# Altium footprint library Connect.PcbLib: 272 footprints (part 4 of 17)
Each footprint in its own frame and in the unit in brackets; x right, y up, seen from the top. Pads: shape width x height; smd on the part's side, far side on the other; paste and mask are expansions set on the pad; w line width, h text height; cw(c..) or ccw(c..) is an arc to the next point about the centre after c.
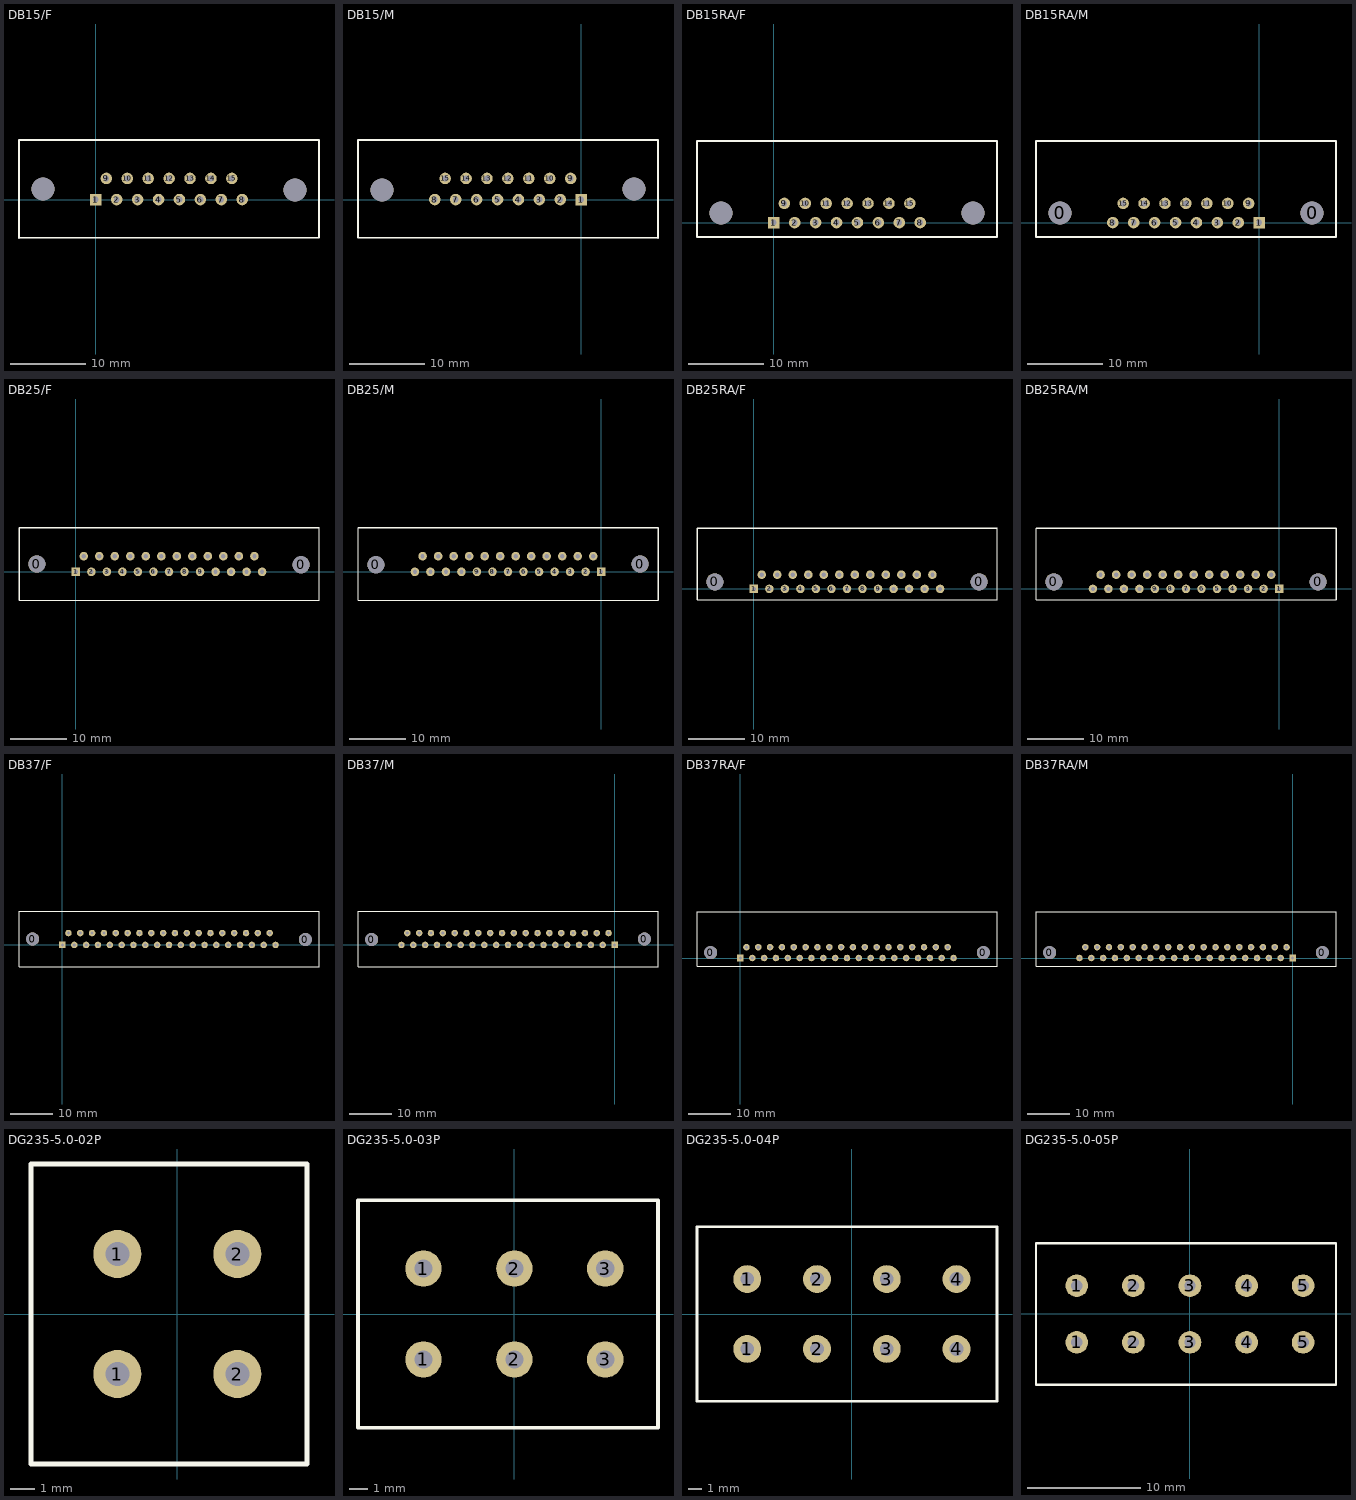
[diagram p3: the footprints below, top view; thin cyan lines are the x and y axes]

## DB15/F [mil]
pads (17):
  rect 60x60 hole 30: 1(0,0)
  round 60 hole 30: 2(109,0) 3(218,0) 4(327,0) 5(436,0) 6(545,0) 7(654,0) 8(763,0) 9(55,110) 10(164,110) 11(273,110) 12(382,110) 13(491,110) 14(600,110) 15(709,110)
  round 120 hole 120: ""(-275,55) ""(1038,50)
Top Overlay:
  lines w8: -400,-200 1163,-200 1163,310
  lines w10: -400,-200 -400,310 1163,310

## DB15/M [mil]
pads (17):
  rect 60x60 hole 30: 1(0,0)
  round 60 hole 30: 2(-109,0) 3(-218,0) 4(-327,0) 5(-436,0) 6(-545,0) 7(-654,0) 8(-763,0) 9(-55,110) 10(-164,110) 11(-273,110) 12(-382,110) 13(-491,110) 14(-600,110) 15(-709,110)
  round 120 hole 120: ""(-1038,50) ""(275,55)
Top Overlay:
  lines w8: -1163,310 -1163,-200 400,-200
  lines w10: -1163,310 400,310 400,-200

## DB15RA/F [mil]
pads (17):
  rect 60x60 hole 30: 1(0,0)
  round 60 hole 30: 2(109,0) 3(218,0) 4(327,0) 5(436,0) 6(545,0) 7(654,0) 8(763,0) 9(55,100) 10(164,100) 11(273,100) 12(382,100) 13(491,100) 14(600,100) 15(709,100)
  round 120 hole 120: ""(-275,50) ""(1038,50)
Top Overlay:
  lines w8: -400,-75 1163,-75 1163,425
  lines w10: -400,-75 -400,425 1163,425

## DB15RA/M [mil]
pads (17):
  round 120 hole 120: 0(-1038,50) 0(275,50)
  rect 60x60 hole 30: 1(0,0)
  round 60 hole 30: 2(-109,0) 3(-218,0) 4(-327,0) 5(-436,0) 6(-545,0) 7(-654,0) 8(-763,0) 9(-55,100) 10(-164,100) 11(-273,100) 12(-382,100) 13(-491,100) 14(-600,100) 15(-709,100)
Top Overlay:
  lines w8: -1163,425 -1163,-75 400,-75
  lines w10: -1163,425 400,425 400,-75

## DB25/F [mil]
pads (27):
  round 120 hole 120: 0(-275,55) 0(1583,50)
  rect 60x60 hole 30: 1(0,0)
  round 60 hole 30: 2(109,0) 3(218,0) 4(327,0) 5(436,0) 6(545,0) 7(654,0) 8(763,0) 9(872,0) 10(981,0) 11(1090,0) 12(1199,0) 13(1308,0) 14(55,110) 15(164,110) 16(273,110) 17(382,110) 18(491,110) 19(600,110) 20(709,110) 21(818,110) 22(927,110) 23(1036,110) 24(1145,110) 25(1254,110)
Top Overlay:
  lines w8: -400,-200 1708,-200 1708,310
  lines w10: -400,-200 -400,310 1708,310

## DB25/M [mil]
pads (27):
  round 120 hole 120: 0(-1583,50) 0(275,55)
  rect 60x60 hole 30: 1(0,0)
  round 60 hole 30: 2(-109,0) 3(-218,0) 4(-327,0) 5(-436,0) 6(-545,0) 7(-654,0) 8(-763,0) 9(-872,0) 10(-981,0) 11(-1090,0) 12(-1199,0) 13(-1308,0) 14(-55,110) 15(-164,110) 16(-273,110) 17(-382,110) 18(-491,110) 19(-600,110) 20(-709,110) 21(-818,110) 22(-927,110) 23(-1036,110) 24(-1145,110) 25(-1254,110)
Top Overlay:
  lines w8: -1708,310 -1708,-200 400,-200
  lines w10: -1708,310 400,310 400,-200

## DB25RA/F [mil]
pads (27):
  round 120 hole 120: 0(-275,50) 0(1583,50)
  rect 60x60 hole 30: 1(0,0)
  round 60 hole 30: 2(109,0) 3(218,0) 4(327,0) 5(436,0) 6(545,0) 7(654,0) 8(763,0) 9(872,0) 10(981,0) 11(1090,0) 12(1199,0) 13(1308,0) 14(55,100) 15(164,100) 16(273,100) 17(382,100) 18(491,100) 19(600,100) 20(709,100) 21(818,100) 22(927,100) 23(1036,100) 24(1145,100) 25(1254,100)
Top Overlay:
  lines w8: -400,-75 1708,-75 1708,425
  lines w10: -400,-75 -400,425 1708,425

## DB25RA/M [mil]
pads (27):
  round 120 hole 120: 0(-1583,50) 0(275,50)
  rect 60x60 hole 30: 1(0,0)
  round 60 hole 30: 2(-109,0) 3(-218,0) 4(-327,0) 5(-436,0) 6(-545,0) 7(-654,0) 8(-763,0) 9(-872,0) 10(-981,0) 11(-1090,0) 12(-1199,0) 13(-1308,0) 14(-55,100) 15(-164,100) 16(-273,100) 17(-382,100) 18(-491,100) 19(-600,100) 20(-709,100) 21(-818,100) 22(-927,100) 23(-1036,100) 24(-1145,100) 25(-1254,100)
Top Overlay:
  lines w8: -1708,425 -1708,-75 400,-75
  lines w10: -1708,425 400,425 400,-75

## DB37/F [mil]
pads (39):
  round 120 hole 120: 0(-275,55) 0(2237,50)
  rect 60x60 hole 30: 1(0,0)
  round 60 hole 30: 2(109,0) 3(218,0) 4(327,0) 5(436,0) 6(545,0) 7(654,0) 8(763,0) 9(872,0) 10(981,0) 11(1090,0) 12(1199,0) 13(1308,0) 14(1417,0) 15(1526,0) 16(1635,0) 17(1744,0) 18(1853,0) 19(1962,0) 20(55,110) 21(164,110) 22(273,110) 23(382,110) 24(491,110) 25(600,110) 26(709,110) 27(818,110) 28(927,110) 29(1036,110) 30(1145,110) 31(1254,110) 32(1363,110) 33(1472,110) 34(1581,110) 35(1690,110) 36(1799,110) 37(1908,110)
Top Overlay:
  lines w8: -400,-200 2362,-200 2362,310
  lines w10: -400,-200 -400,310 2362,310

## DB37/M [mil]
pads (39):
  round 120 hole 120: 0(-2237,50) 0(275,55)
  rect 60x60 hole 30: 1(0,0)
  round 60 hole 30: 2(-109,0) 3(-218,0) 4(-327,0) 5(-436,0) 6(-545,0) 7(-654,0) 8(-763,0) 9(-872,0) 10(-981,0) 11(-1090,0) 12(-1199,0) 13(-1308,0) 14(-1417,0) 15(-1526,0) 16(-1635,0) 17(-1744,0) 18(-1853,0) 19(-1962,0) 20(-55,110) 21(-164,110) 22(-273,110) 23(-382,110) 24(-491,110) 25(-600,110) 26(-709,110) 27(-818,110) 28(-927,110) 29(-1036,110) 30(-1145,110) 31(-1254,110) 32(-1363,110) 33(-1472,110) 34(-1581,110) 35(-1690,110) 36(-1799,110) 37(-1908,110)
Top Overlay:
  lines w8: -2362,310 -2362,-200 400,-200
  lines w10: -2362,310 400,310 400,-200

## DB37RA/F [mil]
pads (39):
  round 120 hole 120: 0(-275,50) 0(2237,50)
  rect 60x60 hole 30: 1(0,0)
  round 60 hole 30: 2(109,0) 3(218,0) 4(327,0) 5(436,0) 6(545,0) 7(654,0) 8(763,0) 9(872,0) 10(981,0) 11(1090,0) 12(1199,0) 13(1308,0) 14(1417,0) 15(1526,0) 16(1635,0) 17(1744,0) 18(1853,0) 19(1962,0) 20(55,100) 21(164,100) 22(273,100) 23(382,100) 24(491,100) 25(600,100) 26(709,100) 27(818,100) 28(927,100) 29(1036,100) 30(1145,100) 31(1254,100) 32(1363,100) 33(1472,100) 34(1581,100) 35(1690,100) 36(1799,100) 37(1908,100)
Top Overlay:
  lines w8: -400,-75 2362,-75 2362,425
  lines w10: -400,-75 -400,425 2362,425

## DB37RA/M [mil]
pads (39):
  round 120 hole 120: 0(-2237,50) 0(275,50)
  rect 60x60 hole 30: 1(0,0)
  round 60 hole 30: 2(-109,0) 3(-218,0) 4(-327,0) 5(-436,0) 6(-545,0) 7(-654,0) 8(-763,0) 9(-872,0) 10(-981,0) 11(-1090,0) 12(-1199,0) 13(-1308,0) 14(-1417,0) 15(-1526,0) 16(-1635,0) 17(-1744,0) 18(-1853,0) 19(-1962,0) 20(-55,100) 21(-164,100) 22(-273,100) 23(-382,100) 24(-491,100) 25(-600,100) 26(-709,100) 27(-818,100) 28(-927,100) 29(-1036,100) 30(-1145,100) 31(-1254,100) 32(-1363,100) 33(-1472,100) 34(-1581,100) 35(-1690,100) 36(-1799,100) 37(-1908,100)
Top Overlay:
  lines w8: -2362,425 -2362,-75 400,-75
  lines w10: -2362,425 400,425 400,-75

## DG235-5.0-02P [mm]
height 15.5
pads (4):
  round 2 hole 1: 1(-2.5,-2.5) 1(-2.5,2.5) 2(2.5,-2.5) 2(2.5,2.5)
Top Overlay:
  lines w0.2: -6.1,-6.25 5.4,-6.25 5.4,6.25 -6.1,6.25 -6.1,-6.25
3D body: height 7, standoff 0, extent -4.7,-6.1 0.275,6.1
3D body: height 9, standoff 7, extent -4.7,-2.5 -0.45,2.5
3D body: height 11, standoff 9, extent -4.425,-1.25 -2.425,1.25
3D body: height 12, standoff 11, extent -4.7,-2.75 -0.45,2
3D body: height 6, standoff 2, extent -4.25,-6.15 -0.25,3.85
3D body: height 0, standoff -3.6, extent -2.7,2.1 -2.3,2.9
3D body: height 0, standoff -3.6, extent -2.7,-2.9 -2.3,-2.1
3D body: height 0, standoff -3.6, extent 2.3,-2.9 2.7,-2.1
3D body: height 0, standoff -3.6, extent 2.3,2.1 2.7,2.9
3D body: height 6, standoff 2, extent 0.75,-6.15 4.75,3.85
3D body: height 12, standoff 11, extent 0.3,-2.75 4.55,2
3D body: height 11, standoff 9, extent 0.575,-1.25 2.575,1.25
3D body: height 9, standoff 7, extent 0.3,-2.5 4.55,2.5
3D body: height 7, standoff 0, extent 0.3,-6.1 5.275,6.1

## DG235-5.0-03P [mm]
height 15.5
pads (6):
  round 2 hole 1: 1(-5,-2.5) 1(-5,2.5) 2(0,-2.5) 2(0,2.5) 3(5,-2.5) 3(5,2.5)
Top Overlay:
  lines w0.2: -8.6,-6.25 -8.6,6.25 7.9,6.25 7.9,-6.25 -8.6,-6.25
3D body: height 7, standoff 0, extent -2.2,-6.1 2.775,6.1
3D body: height 9, standoff 7, extent -2.2,-2.5 2.05,2.5
3D body: height 11, standoff 9, extent -1.925,-1.25 0.075,1.25
3D body: height 12, standoff 11, extent -2.2,-2.75 2.05,2
3D body: height 6, standoff 2, extent -1.75,-6.15 2.25,3.85
3D body: height 0, standoff -3.6, extent -0.2,2.1 0.2,2.9
3D body: height 0, standoff -3.6, extent -0.2,-2.9 0.2,-2.1
3D body: height 0, standoff -3.6, extent -5.2,-2.9 -4.8,-2.1
3D body: height 0, standoff -3.6, extent -5.2,2.1 -4.8,2.9
3D body: height 6, standoff 2, extent -6.75,-6.15 -2.75,3.85
3D body: height 12, standoff 11, extent -7.2,-2.75 -2.95,2
3D body: height 11, standoff 9, extent -6.925,-1.25 -4.925,1.25
3D body: height 9, standoff 7, extent -7.2,-2.5 -2.95,2.5
3D body: height 7, standoff 0, extent -7.2,-6.1 -2.225,6.1
3D body: height 0, standoff -3.6, extent 4.8,-2.9 5.2,-2.1
3D body: height 0, standoff -3.6, extent 4.8,2.1 5.2,2.9
3D body: height 6, standoff 2, extent 3.25,-6.15 7.25,3.85
3D body: height 12, standoff 11, extent 2.8,-2.75 7.05,2
3D body: height 11, standoff 9, extent 3.075,-1.25 5.075,1.25
3D body: height 9, standoff 7, extent 2.8,-2.5 7.05,2.5
3D body: height 7, standoff 0, extent 2.8,-6.1 7.775,6.1

## DG235-5.0-04P [mm]
height 15.5
pads (8):
  round 2 hole 1: 1(-7.5,-2.5) 1(-7.5,2.5) 2(-2.5,-2.5) 2(-2.5,2.5) 3(2.5,-2.5) 3(2.5,2.5) 4(7.5,-2.5) 4(7.5,2.5)
Top Overlay:
  lines w0.2: -11.1,-6.25 -11.1,6.25 10.4,6.25 10.4,-6.25 -11.1,-6.25
3D body: height 7, standoff 0, extent -4.7,-6.1 0.275,6.1
3D body: height 9, standoff 7, extent -4.7,-2.5 -0.45,2.5
3D body: height 11, standoff 9, extent -4.425,-1.25 -2.425,1.25
3D body: height 12, standoff 11, extent -4.7,-2.75 -0.45,2
3D body: height 6, standoff 2, extent -4.25,-6.15 -0.25,3.85
3D body: height 0, standoff -3.6, extent -2.7,2.1 -2.3,2.9
3D body: height 0, standoff -3.6, extent -2.7,-2.9 -2.3,-2.1
3D body: height 0, standoff -3.6, extent -7.7,-2.9 -7.3,-2.1
3D body: height 0, standoff -3.6, extent -7.7,2.1 -7.3,2.9
3D body: height 6, standoff 2, extent -9.25,-6.15 -5.25,3.85
3D body: height 12, standoff 11, extent -9.7,-2.75 -5.45,2
3D body: height 11, standoff 9, extent -9.425,-1.25 -7.425,1.25
3D body: height 9, standoff 7, extent -9.7,-2.5 -5.45,2.5
3D body: height 7, standoff 0, extent -9.7,-6.1 -4.725,6.1
3D body: height 0, standoff -3.6, extent 2.3,-2.9 2.7,-2.1
3D body: height 0, standoff -3.6, extent 2.3,2.1 2.7,2.9
3D body: height 6, standoff 2, extent 0.75,-6.15 4.75,3.85
3D body: height 12, standoff 11, extent 0.3,-2.75 4.55,2
3D body: height 11, standoff 9, extent 0.575,-1.25 2.575,1.25
3D body: height 9, standoff 7, extent 0.3,-2.5 4.55,2.5
3D body: height 7, standoff 0, extent 0.3,-6.1 5.275,6.1
3D body: height 7, standoff 0, extent 5.3,-6.1 10.275,6.1
3D body: height 9, standoff 7, extent 5.3,-2.5 9.55,2.5
3D body: height 11, standoff 9, extent 5.575,-1.25 7.575,1.25
3D body: height 12, standoff 11, extent 5.3,-2.75 9.55,2
3D body: height 6, standoff 2, extent 5.75,-6.15 9.75,3.85
3D body: height 0, standoff -3.6, extent 7.3,2.1 7.7,2.9
3D body: height 0, standoff -3.6, extent 7.3,-2.9 7.7,-2.1

## DG235-5.0-05P [mm]
height 15.5
pads (10):
  round 2 hole 1: 1(-10,-2.5) 1(-10,2.5) 2(-5,-2.5) 2(-5,2.5) 3(0,-2.5) 3(0,2.5) 4(5,-2.5) 4(5,2.5) 5(10,-2.5) 5(10,2.5)
Top Overlay:
  lines w0.2: -13.6,-6.25 12.9,-6.25 12.9,6.25 -13.6,6.25 -13.6,-6.25
3D body: height 0, standoff -3.6, extent 4.8,-2.9 5.2,-2.1
3D body: height 0, standoff -3.6, extent 4.8,2.1 5.2,2.9
3D body: height 6, standoff 2, extent 3.25,-6.15 7.25,3.85
3D body: height 12, standoff 11, extent 2.8,-2.75 7.05,2
3D body: height 11, standoff 9, extent 3.075,-1.25 5.075,1.25
3D body: height 9, standoff 7, extent 2.8,-2.5 7.05,2.5
3D body: height 7, standoff 0, extent 2.8,-6.1 7.775,6.1
3D body: height 7, standoff 0, extent -2.2,-6.1 2.775,6.1
3D body: height 9, standoff 7, extent -2.2,-2.5 2.05,2.5
3D body: height 11, standoff 9, extent -1.925,-1.25 0.075,1.25
3D body: height 12, standoff 11, extent -2.2,-2.75 2.05,2
3D body: height 6, standoff 2, extent -1.75,-6.15 2.25,3.85
3D body: height 0, standoff -3.6, extent -0.2,2.1 0.2,2.9
3D body: height 0, standoff -3.6, extent -0.2,-2.9 0.2,-2.1
3D body: height 7, standoff 0, extent -12.2,-6.1 -7.225,6.1
3D body: height 9, standoff 7, extent -12.2,-2.5 -7.95,2.5
3D body: height 11, standoff 9, extent -11.925,-1.25 -9.925,1.25
3D body: height 12, standoff 11, extent -12.2,-2.75 -7.95,2
3D body: height 6, standoff 2, extent -11.75,-6.15 -7.75,3.85
3D body: height 0, standoff -3.6, extent -10.2,2.1 -9.8,2.9
3D body: height 0, standoff -3.6, extent -10.2,-2.9 -9.8,-2.1
3D body: height 0, standoff -3.6, extent -5.2,-2.9 -4.8,-2.1
3D body: height 0, standoff -3.6, extent -5.2,2.1 -4.8,2.9
3D body: height 6, standoff 2, extent -6.75,-6.15 -2.75,3.85
3D body: height 12, standoff 11, extent -7.2,-2.75 -2.95,2
3D body: height 11, standoff 9, extent -6.925,-1.25 -4.925,1.25
3D body: height 9, standoff 7, extent -7.2,-2.5 -2.95,2.5
3D body: height 7, standoff 0, extent -7.2,-6.1 -2.225,6.1
3D body: height 7, standoff 0, extent 7.8,-6.1 12.775,6.1
3D body: height 9, standoff 7, extent 7.8,-2.5 12.05,2.5
3D body: height 11, standoff 9, extent 8.075,-1.25 10.075,1.25
3D body: height 12, standoff 11, extent 7.8,-2.75 12.05,2
3D body: height 6, standoff 2, extent 8.25,-6.15 12.25,3.85
3D body: height 0, standoff -3.6, extent 9.8,2.1 10.2,2.9
3D body: height 0, standoff -3.6, extent 9.8,-2.9 10.2,-2.1